# Altium footprint library PBL - THD Packages.PcbLib: 174 footprints (part 2 of 11)
Each footprint in its own frame and in the unit in brackets; x right, y up, seen from the top. Pads: shape width x height; smd on the part's side, far side on the other; paste and mask are expansions set on the pad; w line width, h text height; cw(c..) or ccw(c..) is an arc to the next point about the centre after c.
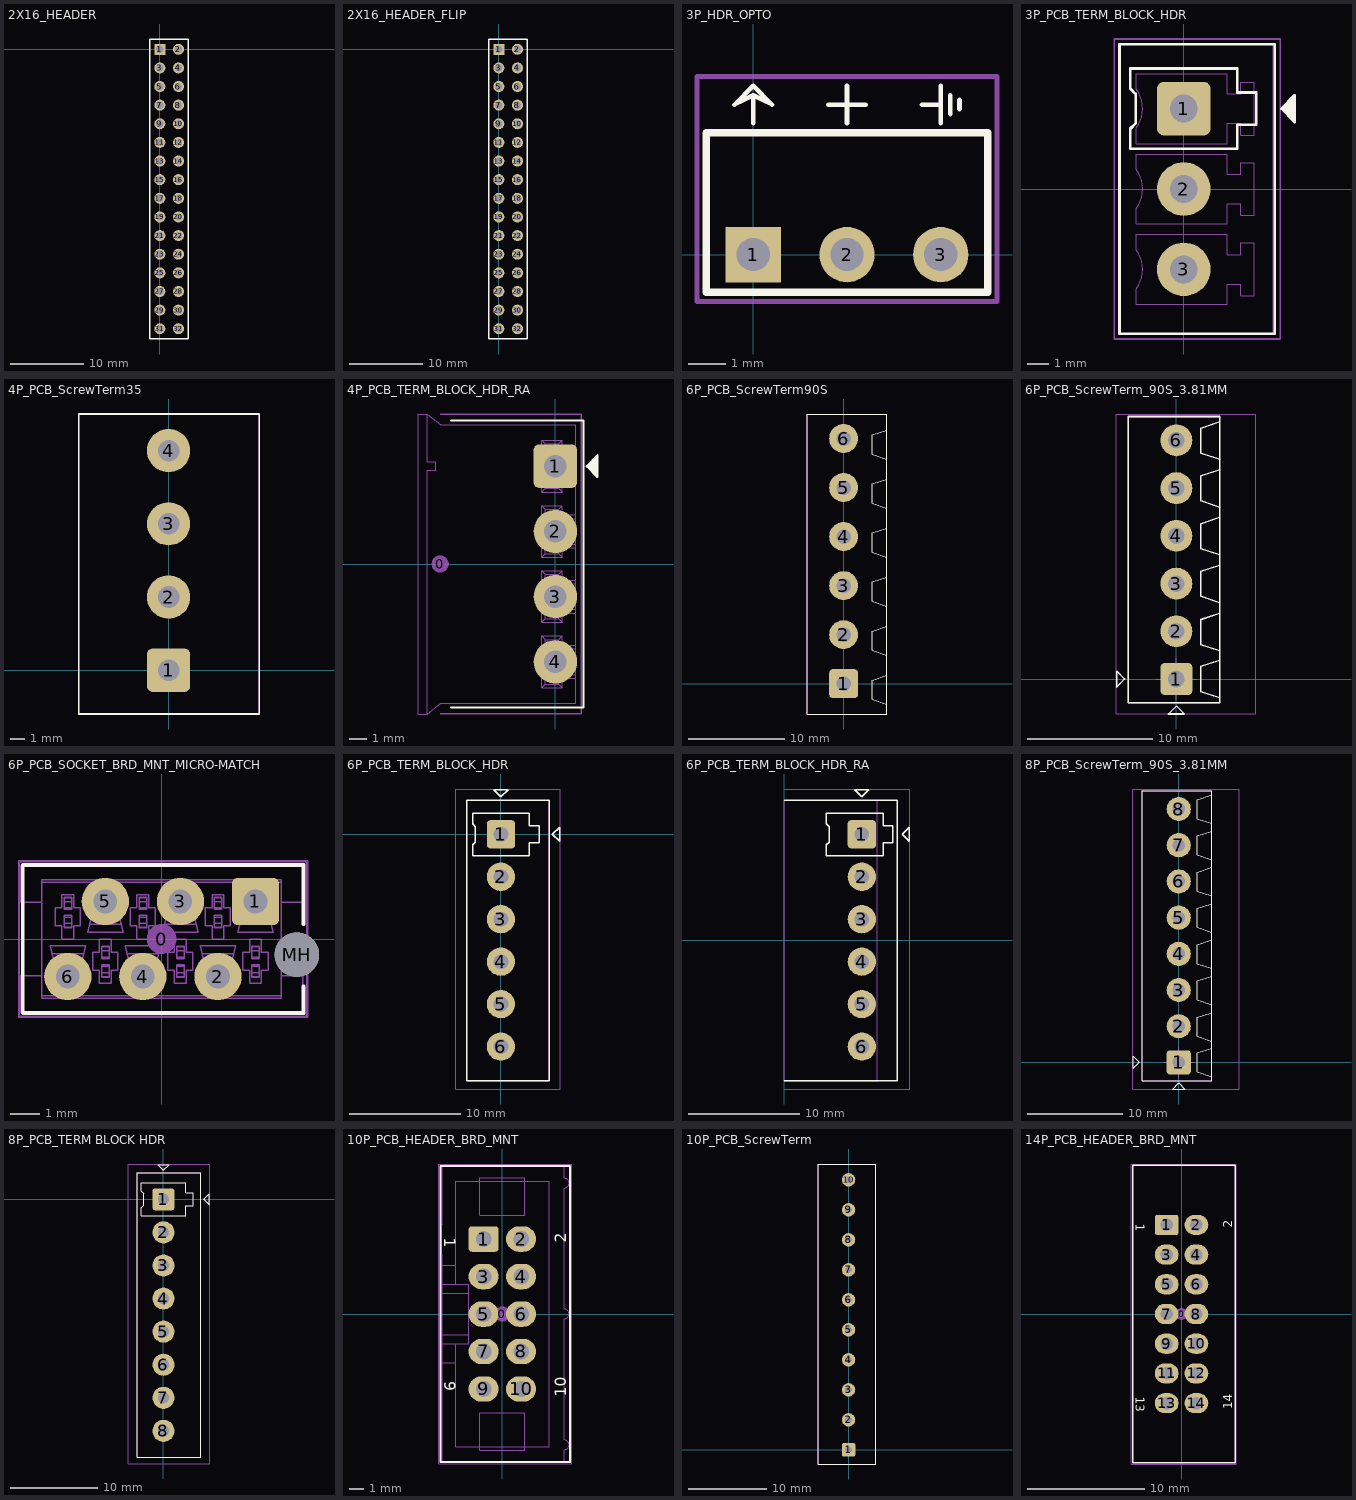
[diagram p1: the footprints below, top view; thin cyan lines are the x and y axes]

## 2X16_HEADER [mm]
pads (32):
  rect 1.5x1.5 hole 1 mask+0.102: 1(0,0)
  round 1.5 hole 1 mask+0.102: 2(2.54,0) 3(0,-2.54) 4(2.54,-2.54) 5(0,-5.08) 6(2.54,-5.08) 7(0,-7.62) 8(2.54,-7.62) 9(0,-10.16) 10(2.54,-10.16) 11(0,-12.7) 12(2.54,-12.7) 13(0,-15.24) 14(2.54,-15.24) 15(0,-17.78) 16(2.54,-17.78) 17(0,-20.32) 18(2.54,-20.32) 19(0,-22.86) 20(2.54,-22.86) 21(0,-25.4) 22(2.54,-25.4) 23(0,-27.94) 24(2.54,-27.94) 25(0,-30.48) 26(2.54,-30.48) 27(0,-33.02) 28(2.54,-33.02) 29(0,-35.56) 30(2.54,-35.56) 31(0,-38.1) 32(2.54,-38.1)
Top Overlay:
  lines w0.2: -1.4,-39.5 -1.4,1.4 3.9,1.4 3.9,-39.5 -1.4,-39.5
3D body: height 9.5, standoff -3.2, extent -1.27,-39.37 3.81,1.27

## 2X16_HEADER_FLIP [mm]
pads (32):
  rect 1.5x1.5 hole 1 mask+0.102: 1(0,0)
  round 1.5 hole 1 mask+0.102: 2(2.54,0) 3(0,-2.54) 4(2.54,-2.54) 5(0,-5.08) 6(2.54,-5.08) 7(0,-7.62) 8(2.54,-7.62) 9(0,-10.16) 10(2.54,-10.16) 11(0,-12.7) 12(2.54,-12.7) 13(0,-15.24) 14(2.54,-15.24) 15(0,-17.78) 16(2.54,-17.78) 17(0,-20.32) 18(2.54,-20.32) 19(0,-22.86) 20(2.54,-22.86) 21(0,-25.4) 22(2.54,-25.4) 23(0,-27.94) 24(2.54,-27.94) 25(0,-30.48) 26(2.54,-30.48) 27(0,-33.02) 28(2.54,-33.02) 29(0,-35.56) 30(2.54,-35.56) 31(0,-38.1) 32(2.54,-38.1)
Top Overlay:
  lines w0.2: -1.4,-39.5 -1.4,1.4 3.9,1.4 3.9,-39.5 -1.4,-39.5
3D body: height 1.4, standoff -11.3, extent -1.27,-39.37 3.81,1.27

## 3P_HDR_OPTO [mm] "Connector; screwterm; 3 Position"
height 10
pads (3):
  rect 1.5x1.5 hole 0.9: 1(0,0)
  round 1.5 hole 0.9: 2(2.54,0) 3(5.08,0)
Top Overlay:
  lines w0.127: 0,3.556 0,4.318 ; 2.032,4.064 3.048,4.064 ; 2.54,3.556 2.54,4.572 ; 4.572,4.064 5.08,4.064 5.08,4.572 5.08,3.556 ; 5.334,3.81 5.334,4.318 ; 5.588,3.937 5.588,4.191 ; 0,4.318 -0.508,4.064 0,4.572 0.508,4.064 0,4.318
  lines w0.2: -1.27,-1.016 -1.27,3.302 6.35,3.302 6.35,-1.016 -1.27,-1.016
15 - Top Courtyards:
  lines w0.127: -1.524,-1.27 -1.524,4.826 6.604,4.826 6.604,-1.27 -1.524,-1.27
3D body: height 6.48, standoff -3.56, extent -1.27,-0.317 6.35,10.732

## 3P_PCB_TERM_BLOCK_HDR [mil] "TERM BLOCK HDR 3POS 3.81MM"
height 362.2
pads (3):
  rrect25% 100x100 hole 52: 1(0,150)
  round 100 hole 52: 2(0,0) 3(0,-150)
Top Overlay:
  region: 182,150 207,175 207,125
  lines w5: -120,-270 170,-270 170,270 -120,270 -120,-270 ; -100,75 100,75 100,120 135,120 135,180 100,180 100,225 -100,225 -100,187.5 -90,177.5 -90,122.5 -100,112.5 -100,75 ; 182,150 207,175 207,125 182,150
13 - 3D Top Side:
  circle w1.97: c0,150 r35.43
  circle w1.97: c0,-150 r35.43
  circle w1.97: c0,0 r35.43
  circle w1.97: c0,150 r43.31
  circle w1.97: c0,0 r43.31
  circle w1.97: c0,-150 r43.31
  lines w1.97: -118.11,-270.08 -118.11,270.08 167.32,270.08 167.32,-270.08 -118.11,-270.08 ; -88.58,-215.16 -88.58,-186.08 ccw(c-137.8,-150) -88.58,-113.92 -88.58,-84.84 80.71,-84.84 80.71,-122.44 106.3,-122.44 106.3,-100.79 131.89,-100.79 131.89,-199.21 106.3,-199.21 106.3,-177.56 80.71,-177.56 80.71,-215.16 -88.58,-215.16 ; -88.58,-65.16 80.71,-65.16 80.71,-27.56 106.3,-27.56 106.3,-49.21 131.89,-49.21 131.89,49.21 106.3,49.21 106.3,27.56 80.71,27.56 80.71,65.16 -88.58,65.16 -88.58,36.08 cw(c-137.8,0) -88.58,-36.08 -88.58,-65.16 ; -88.58,84.84 -88.58,113.92 ccw(c-137.8,150) -88.58,186.08 -88.58,215.16 80.71,215.16 80.71,177.56 106.3,177.56 106.3,199.21 131.89,199.21 131.89,100.79 106.3,100.79 106.3,122.44 80.71,122.44 80.71,84.84 -88.58,84.84 ; -15.75,-165.75 15.75,-165.75 15.75,-134.25 -15.75,-134.25 -15.75,-165.75 ; -15.75,-15.75 15.75,-15.75 15.75,15.75 -15.75,15.75 -15.75,-15.75 ; -15.75,134.25 -15.75,165.75 15.75,165.75 15.75,134.25 -15.75,134.25
15 - Top Courtyards:
  lines w3: -130,-280 180,-280 180,280 -130,280 -130,-280
3D body: height 362.2, standoff -133.86, extent -118.1,-270.08 167.33,270.08

## 4P_PCB_ScrewTerm35 [mm] "TERM BLOCK 4POS 35° ENT 5.08MM"
height 15
pads (4):
  rrect25% 3x3 hole 1.5: 1(0,0)
  round 3 hole 1.5: 2(0,5.08) 3(0,10.16) 4(0,15.24)
Top Overlay:
  lines w0.127: -6.231,-3.04 6.289,-3.04 6.289,17.78 -6.231,17.78 -6.231,-3.04
13 - 3D Top Side:
  lines w0.076: -6.231,-3.04 -6.231,17.78 6.289,17.78 6.289,-3.04 -6.231,-3.04
3D body: height 15.04, standoff -3.76, extent -6.231,-3.04 6.289,17.78

## 4P_PCB_TERM_BLOCK_HDR_RA [mil] "TERM BLOCK HDR 4POS 3.81MM RIGHT-ANGLE"
height 362.2
pads (5):
  round 40 on Mech15: 0(-265,0)
  rrect25% 100x100 hole 52: 1(0,225)
  round 100 hole 52: 2(0,75) 3(0,-75) 4(0,-225)
Top Overlay:
  region: 72,225 97,250 97,200
  lines w5: -240,-330 65,-330 65,330 -240,330 ; 72,225 97,250 97,200 72,225
13 - 3D Top Side:
  lines w1.97: 47.24,-262.8 7.87,-262.8 ; 47.24,-254.53 16.14,-254.53 ; 47.24,-195.47 16.14,-195.47 ; 47.24,-187.2 7.87,-187.2 ; 47.24,-112.8 7.87,-112.8 ; 47.24,-104.53 16.14,-104.53 ; 47.24,-45.47 16.14,-45.47 ; 47.24,-37.2 7.87,-37.2 ; 47.24,37.2 7.87,37.2 ; 47.24,45.47 16.14,45.47 ; 47.24,104.53 16.14,104.53 ; 47.24,112.8 7.87,112.8 ; 47.24,187.2 7.87,187.2 ; 47.24,195.47 16.14,195.47 ; 47.24,254.53 16.14,254.53 ; 47.24,262.8 7.87,262.8 ; -295.28,-345.08 -314.96,-345.08 -314.96,345.08 -295.28,345.08 ; -295.28,-345.08 -295.28,215.16 -275.59,215.16 -275.59,234.84 -295.28,234.84 -295.28,345.08 ; -295.28,-345.08 -263.78,-319.88 47.24,-319.88 47.24,319.88 -263.78,319.88 -295.28,345.08 ; -31.89,-284.45 16.14,-284.45 ; -31.89,-284.45 -23.62,-276.18 ; -31.89,-284.45 -31.89,-165.55 ; -31.89,-165.55 16.14,-165.55 ; -31.89,-165.55 -23.62,-173.82 ; -31.89,-134.45 -31.89,-15.55 ; -31.89,-134.45 16.14,-134.45 ; -31.89,-134.45 -23.62,-126.18 ; -31.89,-15.55 16.14,-15.55 ; -31.89,-15.55 -23.62,-23.82 ; -31.89,15.55 -31.89,134.45 ; -31.89,15.55 16.14,15.55 ; -31.89,15.55 -23.62,23.82 ; -31.89,134.45 16.14,134.45 ; -31.89,134.45 -23.62,126.18 ; -31.89,165.55 -31.89,284.45 ; -31.89,165.55 16.14,165.55 ; -31.89,165.55 -23.62,173.82 ; -31.89,284.45 16.14,284.45 ; -31.89,284.45 -23.62,276.18 ; -23.62,-276.18 7.87,-276.18 ; -23.62,-276.18 -23.62,-173.82 ; -23.62,-173.82 7.87,-173.82 ; -23.62,-126.18 -23.62,-23.82 ; -23.62,-126.18 7.87,-126.18 ; -23.62,-23.82 7.87,-23.82 ; -23.62,23.82 7.87,23.82 ; -23.62,23.82 -23.62,126.18 ; -23.62,126.18 7.87,126.18 ; -23.62,173.82 7.87,173.82 ; -23.62,173.82 -23.62,276.18 ; -23.62,276.18 7.87,276.18 ; 7.87,-276.18 16.14,-284.45 ; 7.87,-276.18 7.87,-262.8 ; 7.87,-262.8 cw(c16.14,-262.8) 16.14,-254.53 ; 7.87,-187.2 ccw(c16.14,-187.2) 16.14,-195.47 ; 7.87,-187.2 7.87,-173.82 ; 7.87,-173.82 16.14,-165.55 ; 7.87,-126.18 16.14,-134.45 ; 7.87,-126.18 7.87,-112.8 ; 7.87,-112.8 cw(c16.14,-112.8) 16.14,-104.53 ; 7.87,-37.2 ccw(c16.14,-37.2) 16.14,-45.47 ; 7.87,-37.2 7.87,-23.82 ; 7.87,-23.82 16.14,-15.55 ; 7.87,23.82 16.14,15.55 ; 7.87,23.82 7.87,37.2 ; 7.87,37.2 cw(c16.14,37.2) 16.14,45.47 ; 7.87,112.8 ccw(c16.14,112.8) 16.14,104.53 ; 7.87,112.8 7.87,126.18 ; 7.87,126.18 16.14,134.45 ; 7.87,173.82 16.14,165.55 ; 7.87,173.82 7.87,187.2 ; 7.87,187.2 cw(c16.14,187.2) 16.14,195.47 ; 7.87,262.8 ccw(c16.14,262.8) 16.14,254.53 ; 7.87,262.8 7.87,276.18 ; 7.87,276.18 16.14,284.45 ; 16.14,-284.45 16.14,-254.53 ; 16.14,-195.47 16.14,-165.55 ; 16.14,-134.45 16.14,-104.53 ; 16.14,-45.47 16.14,-15.55 ; 16.14,15.55 16.14,45.47 ; 16.14,104.53 16.14,134.45 ; 16.14,165.55 16.14,195.47 ; 16.14,254.53 16.14,284.45
15 - Top Courtyards:
  lines w3: -265,-345 60,-345 60,345 -265,345
3D body: height 291.34, standoff -129.92, extent -314.95,-345.07 47.25,345.08

## 6P_PCB_ScrewTerm90S [mm] "TERM BLOCK 6POS SIDE ENT STACKABLE 5.08MM"
height 10
pads (6):
  rrect25% 3x3 hole 1.5: 1(0,0)
  round 3 hole 1.5: 2(0,5.08) 3(0,10.16) 4(0,15.24) 5(0,20.32) 6(0,25.4)
Top Overlay:
  lines w0.127: 4.45,-2.124 2.95,-1.624 2.95,0.376 4.45,0.876 ; 4.45,2.956 2.95,3.456 2.95,5.456 4.45,5.956 ; 4.45,8.036 2.95,8.536 2.95,10.536 4.45,11.036 ; 4.45,13.116 2.95,13.616 2.95,15.616 4.45,16.116 ; 4.45,18.196 2.95,18.696 2.95,20.696 4.45,21.196 ; 4.45,23.276 2.95,23.776 2.95,25.776 4.45,26.276 ; -3.75,-3.14 4.45,-3.14 4.45,27.94 -3.75,27.94 -3.75,-3.14
13 - 3D Top Side:
  lines w0.076: -3.75,-3.14 4.45,-3.14 4.45,27.94 -3.75,27.94 -3.75,-3.14
3D body: height 10.02, standoff -2.58, extent -3.75,-3.14 4.45,27.94

## 6P_PCB_ScrewTerm_90S_3.81MM [mil] "TERM BLOCK 6POS SIDE ENT STACKABLE 3.81MM"
height 334.65
pads (6):
  rrect25% 100x100 hole 52: 1(0,0)
  round 100 hole 52: 2(0,150) 3(0,300) 4(0,450) 5(0,600) 6(0,750)
Top Overlay:
  lines w5: 135.83,-59.06 76.78,-39.37 76.78,39.37 135.83,59.06 ; 135.83,88.58 76.78,108.27 76.78,187.01 135.83,206.69 ; 135.83,240 76.78,259.69 76.78,338.43 135.83,358.11 ; 135.83,390 76.78,409.69 76.78,488.43 135.83,508.11 ; 135.83,540 76.78,559.68 76.78,638.43 135.83,658.11 ; 135.83,690 76.78,709.68 76.78,788.43 135.83,808.11 ; -188,-25 -188,25 -163,0 -188,-25 ; -151.57,-75 135.83,-75 135.83,825 -151.57,825 -151.57,-75 ; -25,-110 0,-85 25,-110 -25,-110
13 - 3D Top Side:
  lines w3: -151.57,-75 -151.57,825 135.83,825 135.83,-75 -151.57,-75
15 - Top Courtyards:
  lines w3: -65,0 65,0 ; 0,-65 0,65 ; -190,-110 250,-110 250,832.88 -190,832.88 -190,-110
3D body: height 335.25, standoff -137.2, extent -151.57,-75 135.83,825

## 6P_PCB_SOCKET_BRD_MNT_MICRO-MATCH [mm] "SOCKET MICRO-MATCH BRD MNT 6POS 2.54MM"
height 4.2
pads (8):
  round 1.016 on Mech15: 0(0,0)
  rrect25% 1.6x1.6 hole 0.8: 1(3.175,1.27)
  round 1.6 hole 0.8: 2(1.905,-1.27) 3(0.635,1.27) 4(-0.635,-1.27) 5(-1.905,1.27) 6(-3.175,-1.27)
  round 1.5 hole 1.5 unplated: MH(4.575,-0.53)
Top Overlay:
  lines w0.127: 4.8,-1.6 4.8,-2.5 -4.7,-2.5 -4.7,2.5 4.8,2.5 4.8,0.5
13 - 3D Top Side:
  drawing of 280 lines, arcs and shapes, not listed
15 - Top Courtyards:
  lines w0.076: -4.827,-2.627 -4.827,2.627 4.927,2.627 4.927,-2.627 -4.827,-2.627
3D body: height 4, standoff -3, extent -4.775,-2.5 4.775,2.5

## 6P_PCB_TERM_BLOCK_HDR [mil] "TERM BLOCK HDR 6POS 3.81MM"
height 362.2
pads (6):
  rrect25% 100x100 hole 52: 1(0,0)
  round 100 hole 52: 2(0,-150) 3(0,-300) 4(0,-450) 5(0,-600) 6(0,-750)
Top Overlay:
  lines w5: -120,-870 170,-870 170,120 -120,120 -120,-870 ; -100,-75 100,-75 100,-30 135,-30 135,30 100,30 100,75 -100,75 -100,37.5 -90,27.5 -90,-27.5 -100,-37.5 -100,-75 ; -25,157 0,132 25,157 -25,157 ; 182,0 207,25 207,-25 182,0
13 - 3D Top Side:
  lines w3: -120,-870 -120,120 170,120 170,-870 -120,-870
15 - Top Courtyards:
  lines w3: -160,-900 210,-900 210,160 -160,160 -160,-900
3D body: height 362.8, standoff -133.26, extent -118.11,-870.07 167.33,120.08
3D body: height 362.2, standoff 0, extent -120,-870 170,120

## 6P_PCB_TERM_BLOCK_HDR_RA [mil] "TERM BLOCK HDR 6POS 3.81MM RIGHT-ANGLE"
height 362.2
pads (6):
  rrect25% 100x100 hole 52: 1(275,375)
  round 100 hole 52: 2(275,225) 3(275,75) 4(275,-75) 5(275,-225) 6(275,-375)
Top Overlay:
  lines w5: 0,-495 400,-495 400,495 0,495 ; 150,300 150,337.5 160,347.5 160,402.5 150,412.5 150,450 350,450 350,405 385,405 385,345 350,345 350,300 150,300 ; 250,532 300,532 275,507 250,532 ; 417,375 442,350 442,400 417,375
13 - 3D Top Side:
  lines w3: 0,-495 330,-495 330,495 0,495 0,-495
15 - Top Courtyards:
  lines w3: 0,-525 445,-525 445,535 0,535
3D body: height 288, standoff -133.26, extent -40,-495.08 322.2,495.08

## 8P_PCB_ScrewTerm_90S_3.81MM [mil] "TERM BLOCK 8POS SIDE ENT STACKABLE 3.81MM"
height 334.65
pads (8):
  rrect25% 100x100 hole 52: 1(0,0)
  round 100 hole 52: 2(0,150) 3(0,300) 4(0,450) 5(0,600) 6(0,750) 7(0,900) 8(0,1050)
Top Overlay:
  lines w5: 135.83,-59.06 76.78,-39.37 76.78,39.37 135.83,59.06 ; 135.83,88.58 76.78,108.27 76.78,187.01 135.83,206.69 ; 135.83,240 76.78,259.69 76.78,338.43 135.83,358.11 ; 135.83,390 76.78,409.69 76.78,488.43 135.83,508.11 ; 135.83,540 76.78,559.68 76.78,638.43 135.83,658.11 ; 135.83,690 76.78,709.68 76.78,788.43 135.83,808.11 ; 135.83,840 76.78,859.68 76.78,938.43 135.83,958.11 ; 135.83,990 76.78,1009.68 76.78,1088.43 135.83,1108.11 ; -188,-25 -188,25 -163,0 -188,-25 ; -151.57,-75 135.83,-75 135.83,1125 -151.57,1125 -151.57,-75 ; -25,-110 0,-85 25,-110 -25,-110
13 - 3D Top Side:
  lines w3: -151.57,-75 -151.57,1125 135.83,1125 135.83,-75 -151.57,-75
15 - Top Courtyards:
  lines w3: -65,0 65,0 ; 0,-65 0,65 ; -190,-110 250,-110 250,1132.88 -190,1132.88 -190,-110
3D body: height 335.25, standoff -137.2, extent -151.57,-75 135.83,1125

## 8P_PCB_TERM BLOCK HDR [mil] "TERM BLOCK HDR 8POS 3.81MM"
height 362.2
pads (8):
  rrect25% 100x100 hole 52: 1(0,0)
  round 100 hole 52: 2(0,-150) 3(0,-300) 4(0,-450) 5(0,-600) 6(0,-750) 7(0,-900) 8(0,-1050)
Top Overlay:
  lines w5: -120,-1170 170,-1170 170,120 -120,120 -120,-1170 ; -100,-75 100,-75 100,-30 135,-30 135,30 100,30 100,75 -100,75 -100,37.5 -90,27.5 -90,-27.5 -100,-37.5 -100,-75 ; -25,157 0,132 25,157 -25,157 ; 182,0 207,25 207,-25 182,0
13 - 3D Top Side:
  lines w3: -120,-1170 -120,120 170,120 170,-1170 -120,-1170
15 - Top Courtyards:
  lines w3: -160,-1200 210,-1200 210,160 -160,160 -160,-1200
3D body: height 362.8, standoff -133.26, extent -118.11,-1170.07 167.33,120.08
3D body: height 362.2, standoff 0, extent -120,-1170 170,120

## 10P_PCB_HEADER_BRD_MNT [mil] "HEADER BRD MNT 10POS 2.54MM"
height 390
pads (11):
  round 40 on Mech15: 0(0,0)
  rrect25% 80x68 hole 42: 1(-50,200)
  oval 80x68 hole 42: 2(50,200) 3(-50,100) 4(50,100) 5(-50,0) 6(50,0) 7(-50,-100) 8(50,-100) 9(-50,-200) 10(50,-200)
Top Overlay:
  lines w5: -165,-395 180,-395 180,395 -165,395 -165,-395
  text "9" at -155,-179 h30
  text "10" at 170,-220.28 h30
  text "1" at -155,203.57 h30
  text "2" at 170,190 h30
13 - 3D Top Side:
  drawing of 154 lines, arcs and shapes, not listed
15 - Top Courtyards:
  lines w3: -170,-400 185,-400 185,400 -170,400 -170,-400
3D body: height 390, standoff -120, extent -161.99,-393.99 178.01,394.01

## 10P_PCB_ScrewTerm [mm] "TERM BLOCK 10POS SIDE ENT 3.81MM"
height 8.5
pads (10):
  rrect25% 1.7x1.7 hole 0.85: 1(0,0)
  round 1.7 hole 0.85: 2(0,3.81) 3(0,7.62) 4(0,11.43) 5(0,15.24) 6(0,19.05) 7(0,22.86) 8(0,26.67) 9(0,30.48) 10(0,34.29)
Top Overlay:
  lines w0.127: -3.85,-1.8 3.45,-1.8 3.45,36.3 -3.85,36.3 -3.85,-1.8
13 - 3D Top Side:
  lines w0.076: -3.85,-1.8 -3.85,36.3 3.45,36.3 3.45,-1.8 -3.85,-1.8
3D body: height 8.5, standoff 0, extent -3.85,-1.8 3.45,36.3

## 14P_PCB_HEADER_BRD_MNT [mil] "HEADER BRD MNT 14POS 2.54MM"
height 390
pads (15):
  round 40 on Mech15: 0(0,0)
  rrect25% 80x68 hole 42: 1(-50,300)
  oval 80x68 hole 42: 2(50,300) 3(-50,200) 4(50,200) 5(-50,100) 6(50,100) 7(-50,0) 8(50,0) 9(-50,-100) 10(50,-100) 11(-50,-200) 12(50,-200) 13(-50,-300) 14(50,-300)
Top Overlay:
  lines w5: -165,-500 180,-500 180,500 -165,500 -165,-500
  text "13" at -155,-279 h30
  text "14" at 170,-320.28 h30
  text "1" at -155,303.57 h30
  text "2" at 170,290 h30
15 - Top Courtyards:
  lines w3: -170,-505 185,-505 185,505 -170,505 -170,-505
3D body: height 390, standoff -120, extent -161.99,-493.99 178.01,494.01